# Altium footprint library xialeste-20221209.PcbLib: 113 footprints (part 3 of 8)
Each footprint in its own frame and in the unit in brackets; x right, y up, seen from the top. Pads: shape width x height; smd on the part's side, far side on the other; paste and mask are expansions set on the pad; w line width, h text height; cw(c..) or ccw(c..) is an arc to the next point about the centre after c.
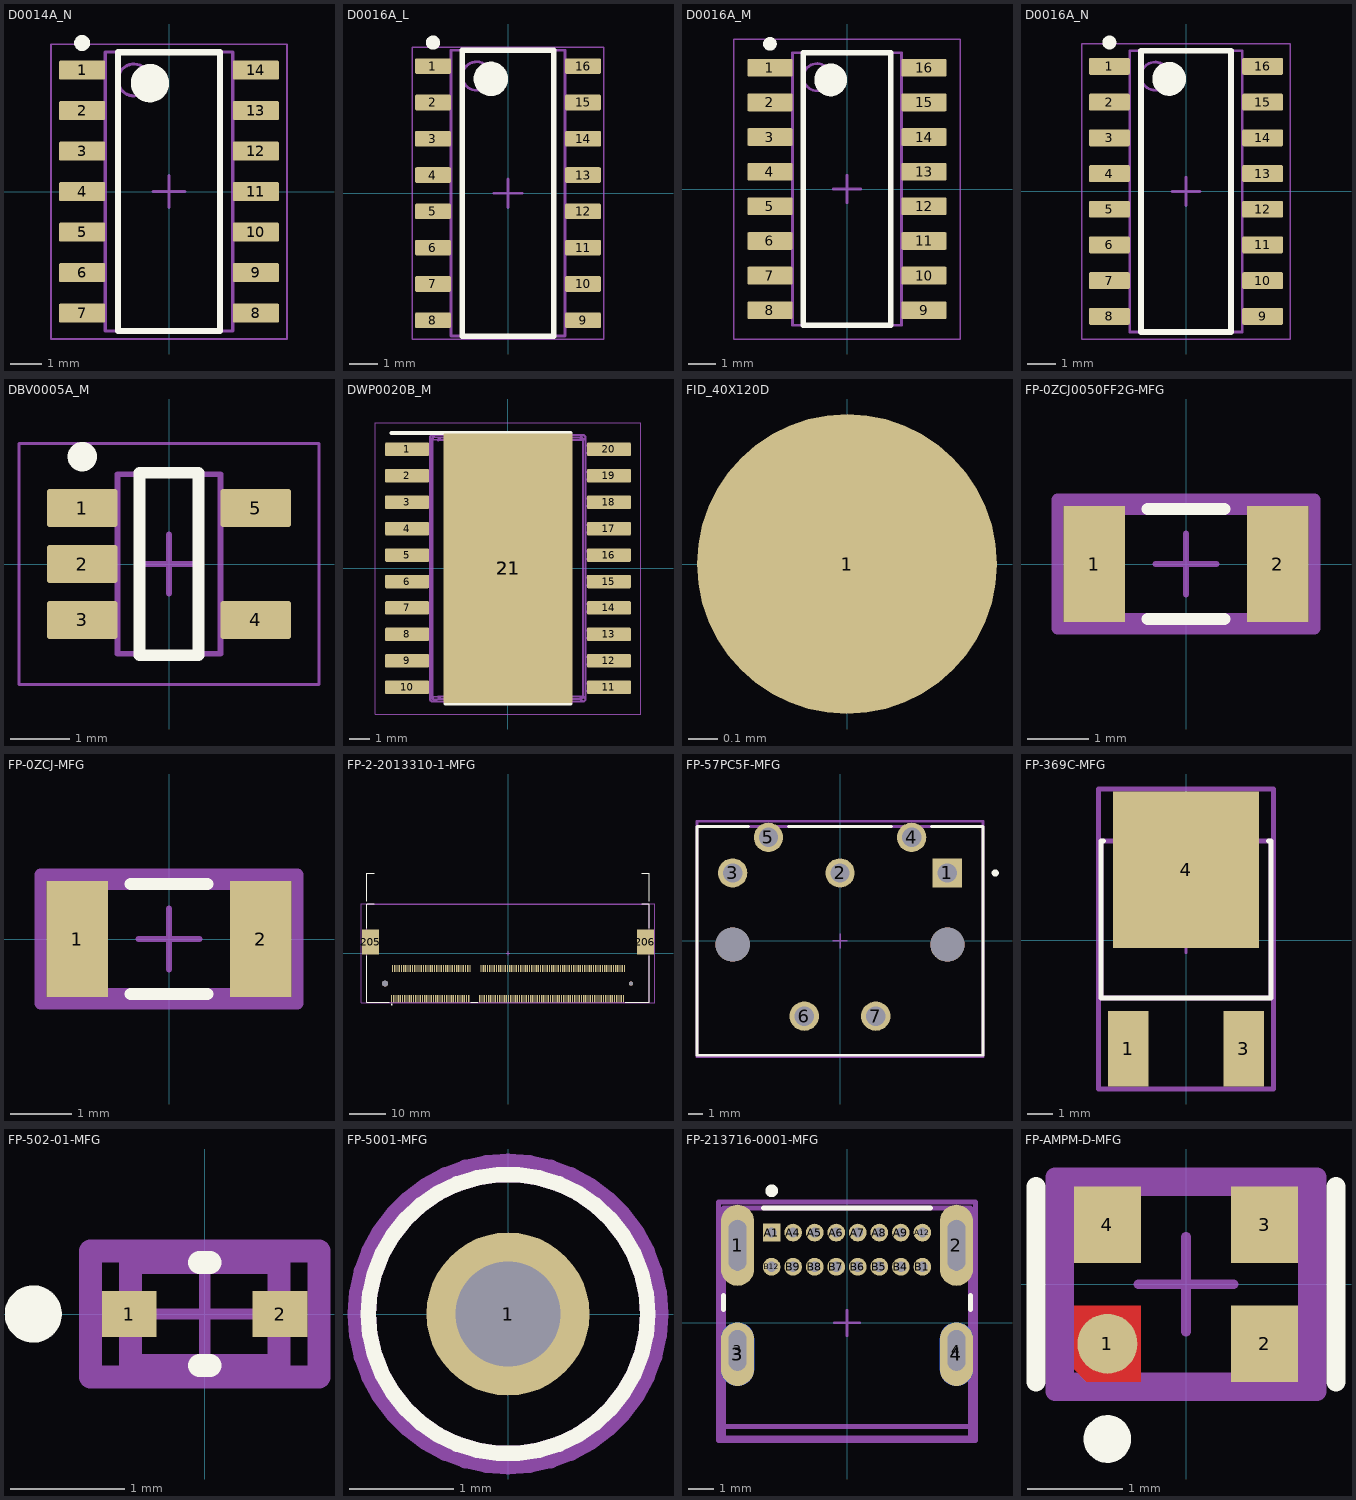
[diagram p2: the footprints below, top view; thin cyan lines are the x and y axes]

## D0014A_N [mm] "SOIC, 14-Leads, Body 8.75x4mm, Pitch 1.27mm, IPC Medium Density"
height 1.75
pads (14):
  rrect17% 1.45x0.6 smd: 1(-2.725,3.81) 2(-2.725,2.54) 3(-2.725,1.27) 4(-2.725,0) 5(-2.725,-1.27) 6(-2.725,-2.54) 7(-2.725,-3.81) 8(2.725,-3.81) 9(2.725,-2.54) 10(2.725,-1.27) 11(2.725,0) 12(2.725,1.27) 13(2.725,2.54) 14(2.725,3.81)
Top Overlay:
  circle w0.25: c-2.725,4.66 r0.125
  circle w0.6: c-0.6,3.4 r0.3
  lines w0.2: -1.6,-4.375 -1.6,4.375 1.6,4.375 1.6,-4.375 -1.6,-4.375
Mechanical 1:
  text ".Designator" at -1.575,-0.35 h0.8
Mechanical 13:
  circle w0.1: c-1.1,3.5 r0.5
  lines w0.1: -2,-4.375 -2,4.375 2,4.375 2,-4.375 -2,-4.375
Mechanical 15:
  lines w0.05: -3.7,-4.625 -3.7,4.625 3.7,4.625 3.7,-4.625 -3.7,-4.625
  lines w0.1: -0.5,0 0.5,0 ; 0,-0.5 0,0.5
3D body "SOIC-14akaD0014AakaM14A.stp": height 1.59, standoff -0.01, extent -3.023,-4.318 3.022,4.318

## D0016A_L [mm] "SOIC, 16-Leads, Body 10x4mm, Pitch 1.27mm, IPC High Density"
height 1.75
pads (16):
  rrect18% 1.25x0.55 smd: 1(-2.625,4.445) 2(-2.625,3.175) 3(-2.625,1.905) 4(-2.625,0.635) 5(-2.625,-0.635) 6(-2.625,-1.905) 7(-2.625,-3.175) 8(-2.625,-4.445) 9(2.625,-4.445) 10(2.625,-3.175) 11(2.625,-1.905) 12(2.625,-0.635) 13(2.625,0.635) 14(2.625,1.905) 15(2.625,3.175) 16(2.625,4.445)
Top Overlay:
  circle w0.25: c-2.625,5.27 r0.125
  circle w0.6: c-0.6,4 r0.3
  lines w0.2: -1.6,-5 -1.6,5 1.6,5 1.6,-5 -1.6,-5
Mechanical 1:
  text ".Designator" at -1.531,-0.319 h0.8
Mechanical 13:
  circle w0.1: c-1.1,4.1 r0.5
  lines w0.1: -2,-5 -2,5 2,5 2,-5 -2,-5
Mechanical 15:
  lines w0.05: -3.35,-5.1 -3.35,5.1 3.35,5.1 3.35,-5.1 -3.35,-5.1
  lines w0.1: -0.5,0 0.5,0 ; 0,-0.5 0,0.5
3D body "SOIC-16akaD0016AakaM16A.stp": height 1.59, standoff -0.01, extent -2.997,-4.953 2.997,4.953

## D0016A_M [mm] "SOIC, 16-Leads, Body 10x4mm, Pitch 1.27mm, IPC Low Density"
height 1.75
pads (16):
  rrect15% 1.65x0.65 smd: 1(-2.825,4.445) 2(-2.825,3.175) 3(-2.825,1.905) 4(-2.825,0.635) 5(-2.825,-0.635) 6(-2.825,-1.905) 7(-2.825,-3.175) 8(-2.825,-4.445) 9(2.825,-4.445) 10(2.825,-3.175) 11(2.825,-1.905) 12(2.825,-0.635) 13(2.825,0.635) 14(2.825,1.905) 15(2.825,3.175) 16(2.825,4.445)
Top Overlay:
  circle w0.25: c-2.825,5.32 r0.125
  circle w0.6: c-0.6,4 r0.3
  lines w0.2: -1.6,-5 -1.6,5 1.6,5 1.6,-5 -1.6,-5
Mechanical 1:
  text ".Designator" at -1.575,-0.35 h0.8
Mechanical 13:
  circle w0.1: c-1.1,4.1 r0.5
  lines w0.1: -2,-5 -2,5 2,5 2,-5 -2,-5
Mechanical 15:
  lines w0.05: -4.15,-5.5 -4.15,5.5 4.15,5.5 4.15,-5.5 -4.15,-5.5
  lines w0.1: -0.5,0 0.5,0 ; 0,-0.5 0,0.5
3D body "SOIC-16akaD0016AakaM16A.stp": height 1.59, standoff -0.01, extent -2.997,-4.953 2.997,4.953

## D0016A_N [mm] "SOIC, 16-Leads, Body 10x4mm, Pitch 1.27mm, IPC Medium Density"
height 1.75
pads (16):
  rrect17% 1.45x0.6 smd: 1(-2.725,4.445) 2(-2.725,3.175) 3(-2.725,1.905) 4(-2.725,0.635) 5(-2.725,-0.635) 6(-2.725,-1.905) 7(-2.725,-3.175) 8(-2.725,-4.445) 9(2.725,-4.445) 10(2.725,-3.175) 11(2.725,-1.905) 12(2.725,-0.635) 13(2.725,0.635) 14(2.725,1.905) 15(2.725,3.175) 16(2.725,4.445)
Top Overlay:
  circle w0.25: c-2.725,5.295 r0.125
  circle w0.6: c-0.6,4 r0.3
  lines w0.2: -1.6,-5 1.6,-5 1.6,5 -1.6,5 -1.6,-5
Mechanical 1:
  text ".Designator" at -1.575,-0.275 h0.8
Mechanical 13:
  circle w0.1: c-1.1,4.1 r0.5
  lines w0.1: -2,-5 -2,5 2,5 2,-5 -2,-5
Mechanical 15:
  lines w0.05: -3.7,-5.25 -3.7,5.25 3.7,5.25 3.7,-5.25 -3.7,-5.25
  lines w0.1: -0.5,0 0.5,0 ; 0,-0.5 0,0.5
3D body "SOIC-16akaD0016AakaM16A.stp": height 1.59, standoff -0.01, extent -2.997,-4.953 2.997,4.953

## DBV0005A_M [mm] "SOT23, 5-Leads, Body 3.05x1.75mm, Pitch 0.95mm, IPC Low Density"
height 1.45
pads (5):
  rrect15% 1.2x0.65 smd: 1(-1.475,0.95) 2(-1.475,0) 3(-1.475,-0.95) 4(1.475,-0.95) 5(1.475,0.95)
Top Overlay:
  circle w0.25: c-1.475,1.825 r0.125
  lines w0.2: -0.5,-1.55 0.5,-1.55 0.5,1.55 -0.5,1.55 -0.5,-1.55
Mechanical 1:
  text ".Designator" at -0.635,-0.127 h0.4
Mechanical 13:
  lines w0.1: -0.875,-1.525 -0.875,1.525 0.875,1.525 0.875,-1.525 -0.875,-1.525
Mechanical 15:
  lines w0.05: -2.55,-2.05 -2.55,2.05 2.55,2.05 2.55,-2.05 -2.55,-2.05
  lines w0.1: -0.5,0 0.5,0 ; 0,-0.5 0,0.5
3D body "DBV0005AaksMF05A.stp": height 1.08, standoff -0.01, extent -1.422,-1.461 1.422,1.46

## DWP0020B_M [mm] "SOP, 20-Leads, Body 13x7.6mm, Pitch 1.27mm, Thermal Pad 2.79x3.81mm, IPC Low Density"
height 2.65
pads (23):
  rrect15% 2.1x0.65 smd: 1(-4.85,5.715) 2(-4.85,4.445) 3(-4.85,3.175) 4(-4.85,1.905) 5(-4.85,0.635) 6(-4.85,-0.635) 7(-4.85,-1.905) 8(-4.85,-3.175) 9(-4.85,-4.445) 10(-4.85,-5.715) 11(4.85,-5.715) 12(4.85,-4.445) 13(4.85,-3.175) 14(4.85,-1.905) 15(4.85,-0.635) 16(4.85,0.635) 17(4.85,1.905) 18(4.85,3.175) 19(4.85,4.445) 20(4.85,5.715)
  rrect2% 6.2x12.95 smd paste-3.1 mask-3.1: 21(0,0)
  rrect50% 2.79x3.81 on Top Paste: 21(0,0)
  rrect50% 2.79x3.81 on Top Solder: 21(0,0)
Top Overlay:
  lines w0.2: -5.6,6.5 3,6.5 ; -3,-6.5 3,-6.5
Mechanical 1:
  text ".Designator" at -1.854,-0.508 h1.02
Top Assembly:
  drawing of 634 lines, arcs and shapes, not listed
Mechanical 15:
  lines w0.05: -6.375,-7 -6.375,7 6.375,7 6.375,-7 -6.375,-7
  lines w0.1: -0.5,0 0.5,0 -0.5,0 ; 0,-0.5 0,0.5 0,-0.5
3D body "DWP0020B.stp": height 2.65, standoff 0, extent -5.216,-6.412 5.216,6.413

## FID_40X120D [mil]
pads (1):
  round 40 smd paste-40 mask+40: 1(0,0)

## FP-0ZCJ0050FF2G-MFG [mm]
pads (2):
  rect 1x1.9 smd paste+0 mask+0: 1(-1.5,0) 2(1.5,0)
Top Overlay:
  lines w0.2: -0.625,-0.9 0.625,-0.9 ; -0.625,0.9 0.625,0.9
Top 3D Body:
  lines w0.2: -1.75,-0.9 1.75,-0.9 1.75,0.9 -1.75,0.9 -1.75,-0.9
Top Courtyard:
  lines w0.2: -2.1,-1.05 -2.1,1.05 2.1,1.05 2.1,-1.05 -2.1,-1.05
Top Assembly:
  lines w0.2: -2.1,-1.05 -2.1,1.05 2.1,1.05 2.1,-1.05 -2.1,-1.05
  text ".Designator" at 0,0.187 h1
Top Component Center:
  lines w0.1: -0.5,0 0.5,0 ; 0,-0.5 0,0.5
3D body "Fuse_Bel_Fuse_0ZCJ0050FF2G_eec.STEP": height 0.25, standoff 0, extent -2.1,-1.05 2.1,1.05

## FP-0ZCJ-MFG [mm]
pads (2):
  rect 1x1.9 smd paste+0 mask+0: 1(-1.5,0) 2(1.5,0)
Top Overlay:
  lines w0.2: -0.625,-0.9 0.625,-0.9 ; -0.625,0.9 0.625,0.9
Top 3D Body:
  lines w0.2: -1.75,-0.9 -1.75,0.9 1.75,0.9 1.75,-0.9 -1.75,-0.9
Top Courtyard:
  lines w0.2: -2.1,-1.05 -2.1,1.05 2.1,1.05 2.1,-1.05 -2.1,-1.05
Top Assembly:
  lines w0.2: -2.1,-1.05 -2.1,1.05 2.1,1.05 2.1,-1.05 -2.1,-1.05
  text ".Designator" at 0,0.187 h1
Top Component Center:
  lines w0.1: -0.5,0 0.5,0 ; 0,-0.5 0,0.5
3D body "Fuse_Bel_0ZCJ0020FF2E_eec.STEP": height 0.25, standoff 0, extent -2.1,-1.05 2.1,1.05

## FP-2-2013310-1-MFG [mm]
pads (208):
  rect 0.35x2 smd paste+0 mask+0: 1(-31.65,-12.35) 2(-31.35,-4.15) 3(-31.05,-12.35) 4(-30.75,-4.15) 5(-30.45,-12.35) 6(-30.15,-4.15) 7(-29.85,-12.35) 8(-29.55,-4.15) 9(-29.25,-12.35) 10(-28.95,-4.15) 11(-28.65,-12.35) 12(-28.35,-4.15) 13(-28.05,-12.35) 14(-27.75,-4.15) 15(-27.45,-12.35) 16(-27.15,-4.15) 17(-26.85,-12.35) 18(-26.55,-4.15) 19(-26.25,-12.35) 20(-25.95,-4.15) 21(-25.65,-12.35) 22(-25.35,-4.15) 23(-25.05,-12.35) 24(-24.75,-4.15) 25(-24.45,-12.35) 26(-24.15,-4.15) 27(-23.85,-12.35) 28(-23.55,-4.15) 29(-23.25,-12.35) 30(-22.95,-4.15) 31(-22.65,-12.35) 32(-22.35,-4.15) 33(-22.05,-12.35) 34(-21.75,-4.15) 35(-21.45,-12.35) 36(-21.15,-4.15) 37(-20.85,-12.35) 38(-20.55,-4.15) 39(-20.25,-12.35) 40(-19.95,-4.15) 41(-19.65,-12.35) 42(-19.35,-4.15) 43(-19.05,-12.35) 44(-18.75,-4.15) 45(-18.45,-12.35) 46(-18.15,-4.15) 47(-17.85,-12.35) 48(-17.55,-4.15) 49(-17.25,-12.35) 50(-16.95,-4.15) 51(-16.65,-12.35) 52(-16.35,-4.15) 53(-16.05,-12.35) 54(-15.75,-4.15) 55(-15.45,-12.35) 56(-15.15,-4.15) 57(-14.85,-12.35) 58(-14.55,-4.15) 59(-14.25,-12.35) 60(-13.95,-4.15) 61(-13.65,-12.35) 62(-13.35,-4.15) 63(-13.05,-12.35) 64(-12.75,-4.15) 65(-12.45,-12.35) 66(-12.15,-4.15) 67(-11.85,-12.35) 68(-11.55,-4.15) 69(-11.25,-12.35) 70(-10.95,-4.15) 71(-10.65,-12.35) 72(-10.35,-4.15) 73(-7.65,-12.35) 74(-7.35,-4.15) 75(-7.05,-12.35) 76(-6.75,-4.15) 77(-6.45,-12.35) 78(-6.15,-4.15) 79(-5.85,-12.35) 80(-5.55,-4.15) 81(-5.25,-12.35) 82(-4.95,-4.15) 83(-4.65,-12.35) 84(-4.35,-4.15) 85(-4.05,-12.35) 86(-3.75,-4.15) 87(-3.45,-12.35) 88(-3.15,-4.15) 89(-2.85,-12.35) 90(-2.55,-4.15) 91(-2.25,-12.35) 92(-1.95,-4.15) 93(-1.65,-12.35) 94(-1.35,-4.15) 95(-1.05,-12.35) 96(-0.75,-4.15) 97(-0.45,-12.35) 98(-0.15,-4.15) 99(0.15,-12.35) 100(0.45,-4.15) 101(0.75,-12.35) 102(1.05,-4.15) 103(1.35,-12.35) 104(1.65,-4.15) 105(1.95,-12.35) 106(2.25,-4.15) 107(2.55,-12.35) 108(2.85,-4.15) 109(3.15,-12.35) 110(3.45,-4.15) 111(3.75,-12.35) 112(4.05,-4.15) 113(4.35,-12.35) 114(4.65,-4.15) 115(4.95,-12.35) 116(5.25,-4.15) 117(5.55,-12.35) 118(5.85,-4.15) 119(6.15,-12.35) 120(6.45,-4.15) 121(6.75,-12.35) 122(7.05,-4.15) 123(7.35,-12.35) 124(7.65,-4.15) 125(7.95,-12.35) 126(8.25,-4.15) 127(8.55,-12.35) 128(8.85,-4.15) 129(9.15,-12.35) 130(9.45,-4.15) 131(9.75,-12.35) 132(10.05,-4.15) 133(10.35,-12.35) 134(10.65,-4.15) 135(10.95,-12.35) 136(11.25,-4.15) 137(11.55,-12.35) 138(11.85,-4.15) 139(12.15,-12.35) 140(12.45,-4.15) 141(12.75,-12.35) 142(13.05,-4.15) 143(13.35,-12.35) 144(13.65,-4.15) 145(13.95,-12.35) 146(14.25,-4.15) 147(14.55,-12.35) 148(14.85,-4.15) 149(15.15,-12.35) 150(15.45,-4.15) 151(15.75,-12.35) 152(16.05,-4.15) 153(16.35,-12.35) 154(16.65,-4.15) 155(16.95,-12.35) 156(17.25,-4.15) 157(17.55,-12.35) 158(17.85,-4.15) 159(18.15,-12.35) 160(18.45,-4.15) 161(18.75,-12.35) 162(19.05,-4.15) 163(19.35,-12.35) 164(19.65,-4.15) 165(19.95,-12.35) 166(20.25,-4.15) 167(20.55,-12.35) 168(20.85,-4.15) 169(21.15,-12.35) 170(21.45,-4.15) 171(21.75,-12.35) 172(22.05,-4.15) 173(22.35,-12.35) 174(22.65,-4.15) 175(22.95,-12.35) 176(23.25,-4.15) 177(23.55,-12.35) 178(23.85,-4.15) 179(24.15,-12.35) 180(24.45,-4.15) 181(24.75,-12.35) 182(25.05,-4.15) 183(25.35,-12.35) 184(25.65,-4.15) 185(25.95,-12.35) 186(26.25,-4.15) 187(26.55,-12.35) 188(26.85,-4.15) 189(27.15,-12.35) 190(27.45,-4.15) 191(27.75,-12.35) 192(28.05,-4.15) 193(28.35,-12.35) 194(28.65,-4.15) 195(28.95,-12.35) 196(29.25,-4.15) 197(29.55,-12.35) 198(29.85,-4.15) 199(30.15,-12.35) 200(30.45,-4.15) 201(30.75,-12.35) 202(31.05,-4.15) 203(31.35,-12.35) 204(31.65,-4.15)
  rect 4.7x6.8 smd paste+0 mask+0: 205(-37.35,3.05) 206(37.35,3.05)
  round 1.6 hole 1.6 unplated paste-1000 mask+0: ""(-33.4,-8.25)
  round 1.1 hole 1.1 unplated paste-1000 mask+0: ""(33.4,-8.25)
Top Overlay:
  circle w0.25: c-31.625,-13.925 r0.125
  lines w0.15: -38.4,-0.725 -38.4,-13.375 -32.2,-13.375 ; -38.4,6.825 -38.4,13.375 ; -38.4,13.4 -36.4,13.4 ; -38.4,14.143 -38.4,21.75 ; -38.4,21.8 -36.4,21.8 ; 31.9,-13.375 38.4,-13.375 38.4,-0.725 ; 36.4,13.4 38.4,13.4 ; 36.4,21.8 38.4,21.8 ; 38.4,6.825 38.4,13.375 ; 38.4,14.143 38.4,21.75
  lines w0.2: -10.1,-13.375 -8.2,-13.375
Top 3D Body:
  lines w0.15: -38.4,-13.375 -38.4,13.375 38.4,13.375 38.4,-13.375 -38.4,-13.375
Top Courtyard:
  lines w0.2: -39.8,-13.475 -39.8,13.475 39.8,13.475 39.8,-13.475 -39.8,-13.475
Top Assembly:
  lines w0.2: -39.8,-13.475 -39.8,13.475 39.8,13.475 39.8,-13.475 -39.8,-13.475
  text ".Designator" at 0,0.187 h1
Top Component Center:
  lines w0.1: -0.5,0 0.5,0 ; 0,-0.5 0,0.5
3D body "Conn_TE_Connectivity_2-2013310-1_eec.STEP": height 0.25, standoff 0, extent -39.8,-13.475 39.8,13.475

## FP-57PC5F-MFG [mm]
pads (9):
  rect 2.05x2.05 hole 1.35 paste-1000 mask+0: 1(7.505,4.75)
  round 2.05 hole 1.35 paste-1000 mask+0: 2(0,4.75) 3(-7.505,4.75) 4(5.005,7.24) 5(-5.005,7.24) 6(-2.5,-5.26) 7(2.5,-5.26)
  round 2.39 hole 2.39 unplated paste-1000 mask+0: ""(-7.505,-0.26) ""(7.505,-0.26)
Top Overlay:
  circle w0.25: c10.85,4.75 r0.125
  lines w0.2: -6.405,8 -10,8 -10,-8 10,-8 10,8 6.405,8 ; -3.605,8 3.605,8
Top 3D Body:
  lines w0.2: -10,-8 -10,8 10,8 10,-8 -10,-8
Top Courtyard:
  lines w0.2: -10,-8.1 -10,8.365 10,8.365 10,-8.1 -10,-8.1
Top Assembly:
  lines w0.2: -10,-8.1 -10,8.365 10,8.365 10,-8.1 -10,-8.1
  text ".Designator" at 0,0.32 h1
Top Component Center:
  lines w0.1: -0.5,0 0.5,0 ; 0,-0.5 0,0.5
3D body "Conn_Switchcraft_57PC5F_eec.STEP": height 0.25, standoff 0, extent -10.35,-8.1 10.35,8.365

## FP-369C-MFG [mm]
pads (3):
  rect 1.6x3 smd paste+0 mask+0: 1(-2.285,-4.3) 3(2.285,-4.3)
  rect 5.8x6.2 smd paste+0 mask+0: 4(0,2.79)
Top Overlay:
  lines w0.2: -3.275,3.935 -3.365,3.935 -3.365,-2.285 3.365,-2.285 3.365,3.935 3.275,3.935
Top 3D Body:
  lines w0.2: -3.365,-2.285 3.365,-2.285 3.365,3.935 -3.365,3.935 -3.365,-2.285
Top Courtyard:
  lines w0.2: -3.465,-5.9 3.465,-5.9 3.465,5.99 -3.465,5.99 -3.465,-5.9
Top Assembly:
  lines w0.2: -3.465,-5.9 3.465,-5.9 3.465,5.99 -3.465,5.99 -3.465,-5.9
  text ".Designator" at 0,0.044 h1
Top Component Center:
  lines w0.1: -0.5,0 0.5,0 ; 0,-0.5 0,0.5
3D body "IC_ON_Semiconductor_MC7805CDTG_eec.STEP": height 0.25, standoff 0, extent -3.465,-5.9 3.465,5.99

## FP-502-01-MFG [mm]
pads (2):
  rect 0.48x0.4 smd paste+0 mask+0: 1(-0.66,0) 2(0.66,0)
Top Overlay:
  circle w0.25: c-1.5,0 r0.125
  lines w0.2: -0.045,-0.45 0.045,-0.45 ; -0.045,0.45 0.045,0.45
Top 3D Body:
  lines w0.2: -0.65,-0.45 0.65,-0.45 0.65,0.45 -0.65,0.45 -0.65,-0.45
Top Courtyard:
  lines w0.2: -1,-0.55 1,-0.55 1,0.55 -1,0.55 -1,-0.55
Top Assembly:
  lines w0.2: -1,-0.55 1,-0.55 1,0.55 -1,0.55 -1,-0.55
  text ".Designator" at 0,-0.001 h1
Top Component Center:
  lines w0.1: -0.5,0 0.5,0 ; 0,-0.5 0,0.5
3D body "Diode_ON_Semiconductor_1N914BWT_eec.STEP": height 0.25, standoff 0, extent -1,-0.55 1,0.55

## FP-5001-MFG [mm]
pads (1):
  round 1.57 hole 1.016 paste-1000 mask+0: 1(0,0)
Top Overlay:
  circle w0.15: c0,0 r1.345
Top 3D Body:
  circle w0.15: c0,0 r1.345
Top Courtyard:
  lines w0.2: -1.445,0 ccw(c0,0) 1.445,0 ccw(c0,0) -1.445,0
Top Assembly:
  text ".Designator" at 0,0.187 h1
Top Component Center:
  lines w0.1: -0.5,0 0.5,0 ; 0,-0.5 0,0.5
3D body "Conn_Keystone_5001_eec.STEP": height 0.25, standoff 0, extent -1.445,-1.445 1.445,1.445

## FP-213716-0001-MFG [mm]
pads (24):
  rrect100% 1.3x3.2 hole 2 slot 0.7 at 0 deg paste-1000 mask+0: 1(-4.32,3.065) 2(4.32,3.065)
  rrect100% 1.3x2.5 smd paste-1000 mask+0: 3(-4.32,-1.235) 4(4.32,-1.235)
  rrect100% 1.3x2.5 smd far side paste-1000 mask+0: 3(-4.32,-1.235) 4(4.32,-1.235)
  rrect100% 0.7x1.6 hole 1.6 slot 0.7 at 0 deg paste-1000 mask+0: 3(-4.32,-1.085) 4(4.32,-1.085)
  rect 0.7x0.7 hole 0.4 paste-1000 mask+0: A1(-2.975,3.565)
  round 0.7 hole 0.4 paste-1000 mask+0: A4(-2.125,3.565) A5(-1.275,3.565) A6(-0.425,3.565) A7(0.425,3.565) A8(1.275,3.565) A9(2.125,3.565) A12(2.975,3.565) B1(2.975,2.215) B4(2.125,2.215) B5(1.275,2.215) B6(0.425,2.215) B7(-0.425,2.215) B8(-1.275,2.215) B9(-2.125,2.215) B12(-2.975,2.215)
Top Overlay:
  circle w0.25: c-2.975,5.215 r0.125
  lines w0.2: -4.87,0.54 -4.87,1.09 ; -3.295,4.535 3.295,4.535 ; 4.87,0.54 4.87,1.09
Top 3D Body:
  lines w0.2: -5.07,-4.085 5.07,-4.085 ; -4.87,-4.535 -4.87,4.535 4.87,4.535 4.87,-4.535 -4.87,-4.535
Top Courtyard:
  lines w0.2: -5.07,-4.635 -5.07,4.765 5.07,4.765 5.07,-4.635 -5.07,-4.635
Top Assembly:
  lines w0.2: -5.07,-4.635 -5.07,4.765 5.07,4.765 5.07,-4.635 -5.07,-4.635
  text ".Designator" at 0,0.252 h1
Top Component Center:
  lines w0.1: -0.5,0 0.5,0 ; 0,-0.5 0,0.5
3D body "Conn_Molex_213716-0001_eec.STEP": height 0.25, standoff 0, extent -5.07,-4.635 5.07,4.765

## FP-AMPM-D-MFG [mm]
pads (4):
  round 0.63 smd paste+0 mask+0: 1(-0.825,-0.625)
  rect 0.7x0.8 smd paste+0 mask+0: 2(0.825,-0.625) 3(0.825,0.625) 4(-0.825,0.625)
Top Layer:
  region: -1.175,-0.225 -0.475,-0.225 -0.475,-1.025 -1.045,-1.025 -1.175,-0.895
Top Overlay:
  circle w0.25: c-0.825,-1.625 r0.125
  lines w0.2: -1.575,-1.025 -1.575,1.025 ; 1.575,-1.025 1.575,1.025
Top 3D Body:
  lines w0.2: -1.275,-1.025 1.275,-1.025 1.275,1.025 -1.275,1.025 -1.275,-1.025
Top Courtyard:
  lines w0.2: -1.375,-1.125 1.375,-1.125 1.375,1.125 -1.375,1.125 -1.375,-1.125
Top Assembly:
  lines w0.2: -1.375,-1.125 1.375,-1.125 1.375,1.125 -1.375,1.125 -1.375,-1.125
  text ".Designator" at 0,-0.001 h1
Top Component Center:
  lines w0.1: -0.5,0 0.5,0 ; 0,-0.5 0,0.5
3D body "Crys_Abracon_AMPMDDA-50_0000T3_eec.STEP": height 0.25, standoff 0, extent -1.375,-1.125 1.375,1.125